# Altium footprint library TO系列封装.PcbLib: 129 footprints (part 9 of 9)
Each footprint in its own frame and in the unit in brackets; x right, y up, seen from the top. Pads: shape width x height; smd on the part's side, far side on the other; paste and mask are expansions set on the pad; w line width, h text height; cw(c..) or ccw(c..) is an arc to the next point about the centre after c.
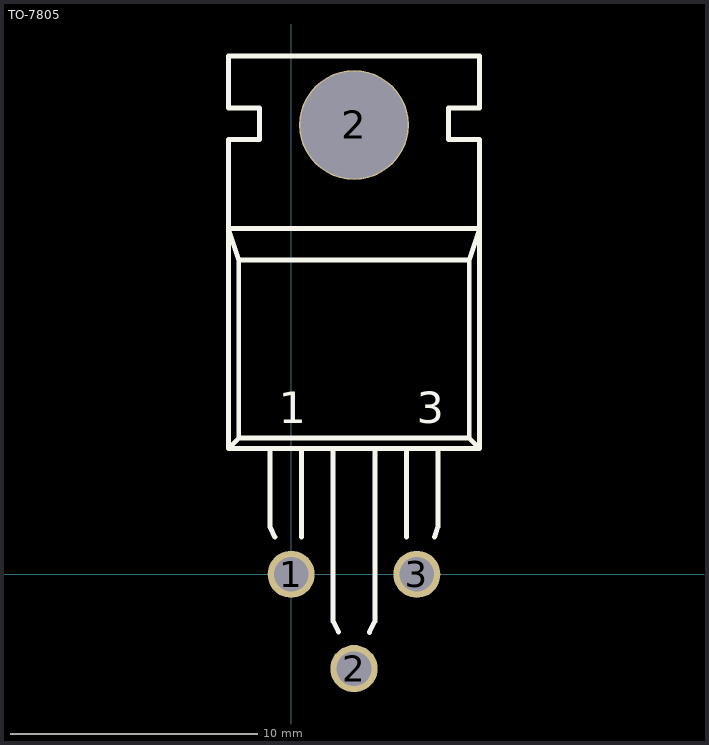
[diagram p8: the footprint, top view; thin cyan lines are the x and y axes]

## TO-7805 [mil]
pads (4):
  round 75 hole 55: 1(0,0) 2(100,-150) 3(200,0)
  round 175 hole 170: 2(100,715)
Top Overlay:
  lines w7.87: -33.33,200 -33.33,75 -25.8,59.05 ; 16.67,59.05 16.67,200 ; 66.67,200 66.67,-75 75.46,-92.13 ; 124.54,-92.27 133.33,-75 133.33,200 ; 183.33,59.05 183.33,200 ; 228,59.05 233.33,75 233.33,200 ; -100,200 -100,691.67 -50,691.67 -50,741.67 -100,741.67 -100,825 300,825 300,741.67 250,741.67 250,691.67 300,691.67 300,591.67 300,200 ; -100,200 300,200 ; -100,200 -83.33,216.67 ; -83.33,216.67 -83.33,500 ; -83.33,216.67 283.33,216.67 ; -83.33,500 -100,550 300,550 283.33,500 ; -83.33,500 283.33,500 ; 283.33,216.67 300,200 ; 283.33,216.67 283.33,500
  text "3" at 200,240 h50
  text "1" at -20,240 h50